# Altium footprint library OpenBMS.PcbLib: 26 footprints (part 2 of 2)
Each footprint in its own frame and in the unit in brackets; x right, y up, seen from the top. Pads: shape width x height; smd on the part's side, far side on the other; paste and mask are expansions set on the pad; w line width, h text height; cw(c..) or ccw(c..) is an arc to the next point about the centre after c.
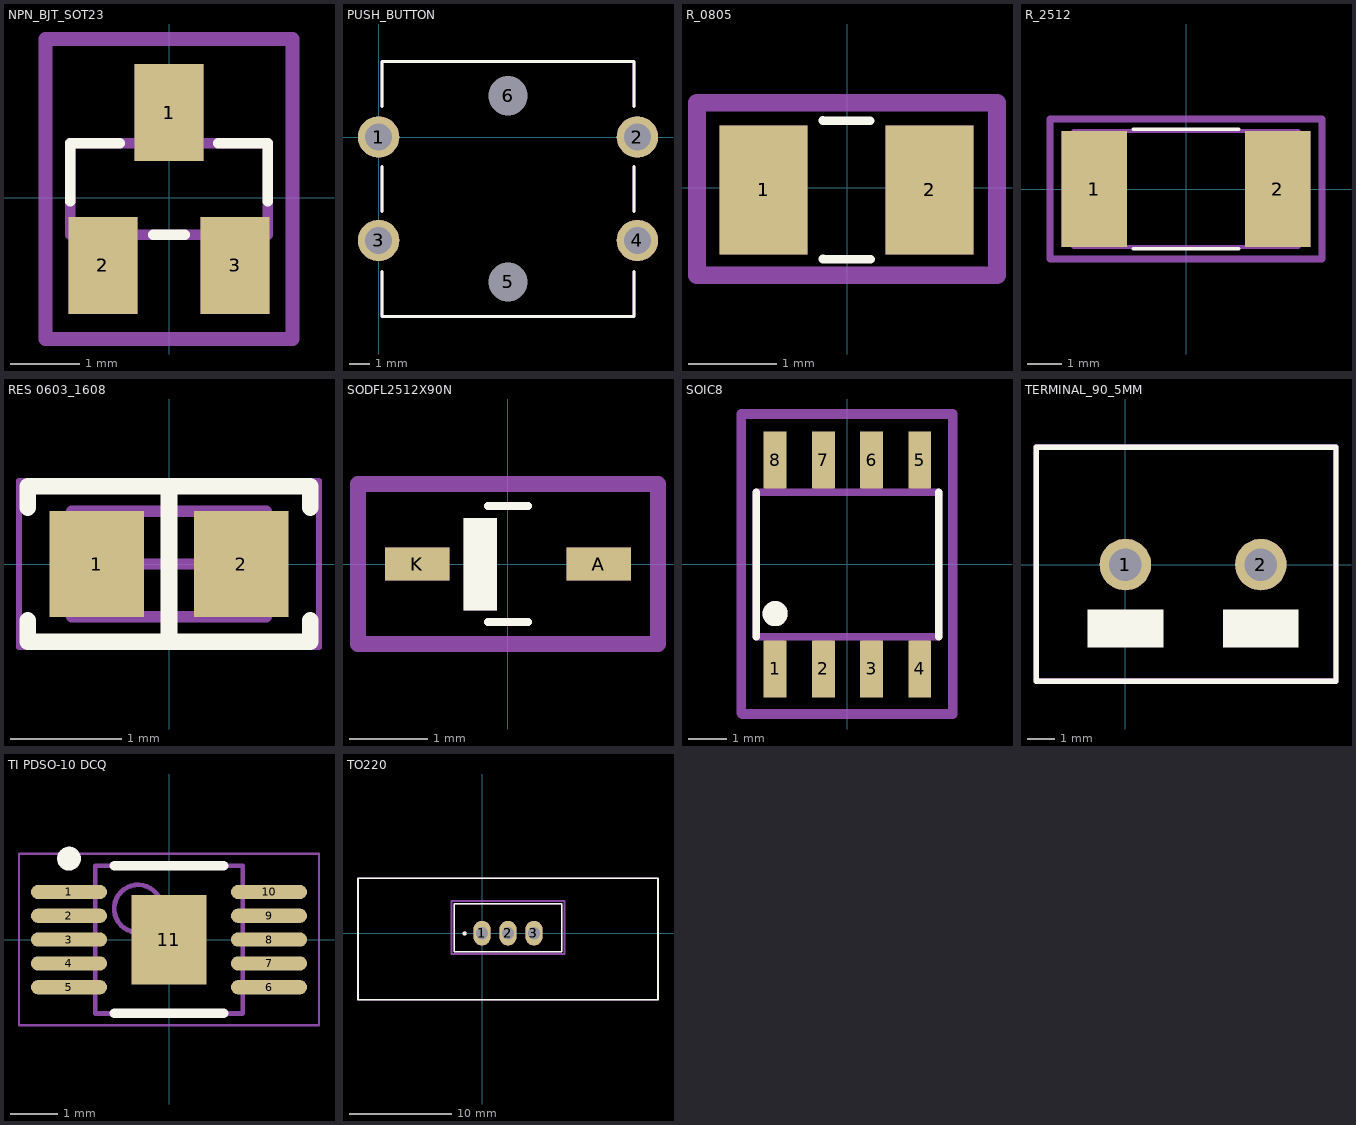
[diagram p1: the footprints below, top view; thin cyan lines are the x and y axes]

## NPN_BJT_SOT23 [mm]
pads (6):
  rect 1x1.4 smd: 1(0,1.227) 2(-0.95,-0.973) 3(0.95,-0.973)
  rect 1x1.4 on Mech15: 1(0,1.227) 2(-0.95,-0.973) 3(0.95,-0.973)
Top Overlay:
  lines w0.152: -1.422,-0.051 -1.422,0.787 -0.711,0.787 ; -0.229,-0.533 0.229,-0.533 ; 0.711,0.787 1.422,0.787 1.422,-0.051
Mechanical 4:
  region: -1.17,-0.584 -0.711,-0.584 -0.711,-1.17 -1.17,-1.17
  region: 0.711,-0.584 1.168,-0.584 1.168,-1.169 0.711,-1.169
  region: -0.229,1.422 0.229,1.422 0.229,0.838 -0.229,0.838
  region: -1.17,-0.584 -0.711,-0.584 -0.711,-1.17 -1.17,-1.17
  region: 0.711,-0.584 1.168,-0.584 1.168,-1.169 0.711,-1.169
  region: -0.229,1.422 0.229,1.422 0.229,0.838 -0.229,0.838
  lines w0.152: -1.422,-0.533 -1.422,0.787 1.422,0.787 1.422,-0.533 -1.422,-0.533
Mechanical 15:
  lines w0.152: -1.422,-0.051 -1.422,0.787 -0.711,0.787 ; -0.229,-0.533 0.229,-0.533 ; 0.711,0.787 1.422,0.787 1.422,-0.051
  lines w0.2: -1.778,-2.032 1.778,-2.032 1.778,2.286 -1.778,2.286 -1.778,-2.032
3D body "BC846B.STEP": height 1.11, standoff 0.01, extent -1.45,-1.023 1.45,1.277

## PUSH_BUTTON [mm]
pads (12):
  round 2 hole 1.3: 1(0,0) 2(12.5,0) 3(0,-5) 4(12.5,-5)
  round 2 on Mech15: 1(0,0) 2(12.5,0) 3(0,-5) 4(12.5,-5)
  round 1.5 hole 1.9: 5(6.25,-7.003) 6(6.25,1.997)
  round 1.5 on Mech15: 5(6.25,-7.003) 6(6.25,1.997)
Top Overlay:
  lines w0.152: 0.154,-6.512 0.154,-8.671 12.346,-8.671 12.346,-6.512 ; 0.154,-3.591 0.154,-1.432 ; 0.154,1.489 0.154,3.648 12.346,3.648 12.346,1.489 ; 12.346,-3.591 12.346,-1.432
Mechanical 15:
  lines w0.152: 0.154,-6.512 0.154,-8.671 12.346,-8.671 12.346,-6.512 ; 0.154,-3.591 0.154,-1.432 ; 0.154,1.489 0.154,3.648 12.346,3.648 12.346,1.489 ; 12.346,-3.591 12.346,-1.432
3D body "b3f-4000.stp": height 4.31, standoff -3.49, extent -0.65,-8.499 13.15,3.501

## R_0805 [mm]
pads (4):
  rect 1x1.47 smd: 1(-0.95,-0.025) 2(0.939,-0.025)
  rect 1x1.47 on Mech15: 1(-0.95,-0.025) 2(0.939,-0.025)
Top Overlay:
  lines w0.1: -0.278,0.765 0.262,0.762 ; -0.275,-0.813 0.265,-0.815
Mechanical 15:
  lines w0.2: -1.709,-0.998 -1.709,0.968 1.707,0.968 1.707,-0.998 -1.709,-0.998
3D body "CRCW08051R96FNEB.STEP": height 0.47, standoff -0.03, extent -1.025,-0.65 0.975,0.6

## R_2512 [mm]
pads (4):
  rect 1.9x3.37 smd: 1(-2.66,0) 2(2.66,0)
  rect 1.9x3.37 on Mech15: 1(-2.66,0) 2(2.66,0)
Top Overlay:
  lines w0.1: -1.524,-1.727 1.524,-1.727 ; -1.524,1.727 1.524,1.727
Mechanical 4:
  lines w0.127: -3.25,-1.68 -3.25,1.68 ; -3.25,-1.68 3.25,-1.68 ; -3.25,-1.68 -3.25,1.68 ; -3.25,-1.68 3.25,-1.68 ; -3.25,1.68 3.25,1.68 ; -3.25,1.68 3.25,1.68 ; 3.25,-1.68 3.25,1.68 ; 3.25,-1.68 3.25,1.68
Mechanical 15:
  lines w0.2: -3.937,-2.032 -3.937,2.032 3.937,2.032 3.937,-2.032 -3.937,-2.032
3D body "CRGP2512F39R.STEP": height 0.66, standoff 0.01, extent -3.2,-1.6 3.15,1.6

## RES 0603_1608 [mm] "Chip Resistor, 2-Leads, Body 1.60x0.80mm, IPC Medium Density"
height 0.45
pads (2):
  rect 0.85x0.95 smd: 1(-0.65,0) 2(0.65,0)
Top Overlay:
  lines w0.15: -1.27,-0.508 -1.27,-0.7 1.27,-0.7 1.27,-0.508 ; -1.27,0.508 -1.27,0.7 1.27,0.7 1.27,0.508 ; 0,-0.7 0,0.7
Mechanical 13:
  lines w0.1: -0.875,-0.475 -0.875,0.475 0.875,0.475 0.875,-0.475 -0.875,-0.475
Mechanical 15:
  lines w0.05: -1.35,-0.75 -1.35,0.75 1.35,0.75 1.35,-0.75 -1.35,-0.75
  lines w0.1: -0.475,0 0.475,0 ; 0,-0.475 0,0.475
3D body "0603 resistor.STEP": height 0.45, standoff 0, extent -0.8,-0.4 0.8,0.4

## SODFL2512X90N [mm]
pads (4):
  rect 0.82x0.42 smd: A(1.15,0) K(-1.15,0)
  rect 0.82x0.42 on Mech15: A(1.15,0) K(-1.15,0)
Top Overlay:
  region: -0.141,-0.584 -0.559,-0.584 -0.559,0.584 -0.141,0.584
  lines w0.1: -0.254,-0.737 0.254,-0.737 ; -0.254,0.737 0.254,0.737
Mechanical 15:
  region: -0.141,-0.584 -0.559,-0.584 -0.559,0.584 -0.141,0.584
  lines w0.1: -0.254,-0.737 0.254,-0.737 ; -0.254,0.737 0.254,0.737
  lines w0.2: -1.905,-1.016 1.905,-1.016 1.905,1.016 -1.905,1.016 -1.905,-1.016
3D body "User Library-SOD-323F.STEP": height 0.78, standoff -0.1, extent -1.368,-0.675 1.332,0.675

## SOIC8 [mm]
pads (8):
  rect 0.6x1.5 smd: 1(-1.905,-2.75) 2(-0.635,-2.75) 3(0.635,-2.75) 4(1.905,-2.75) 5(1.905,2.75) 6(0.635,2.75) 7(-0.635,2.75) 8(-1.905,2.75)
Top Overlay:
  circle w0.508: c-1.905,-1.295 r0.076
  lines w0.203: -2.4,-1.9 -2.4,-1.4 -2.4,1.9 ; 2.4,-1.9 2.4,-1.4 2.4,1.9
Mechanical 15:
  circle w0.508: c-1.905,-1.295 r0.076
  region: 2.15,2 1.66,2 1.66,3.1 2.15,3.1
  region: 2.15,-3.1 1.66,-3.1 1.66,-2 2.15,-2
  region: -1.66,2 -2.15,2 -2.15,3.1 -1.66,3.1
  region: -1.66,-3.1 -2.15,-3.1 -2.15,-2 -1.66,-2
  region: 0.88,2 0.39,2 0.39,3.1 0.88,3.1
  region: 0.88,-3.1 0.39,-3.1 0.39,-2 0.88,-2
  region: -0.39,2 -0.88,2 -0.88,3.1 -0.39,3.1
  region: -0.39,-3.1 -0.88,-3.1 -0.88,-2 -0.39,-2
  lines w0.203: -2.4,-1.9 -2.4,-1.4 -2.4,1.9 2.4,1.9 2.4,-1.4 2.4,-1.9 -2.4,-1.9
  lines w0.254: -2.794,-3.912 -2.769,-3.937 2.769,-3.937 2.769,3.962 -2.794,3.962 -2.794,-3.912
3D body "THVD1429DT--3DModel-STEP-56544.STEP": height 1.75, standoff 0, extent -2.451,-2.997 2.451,2.997

## TERMINAL_90_5MM [mm]
pads (4):
  round 1.9 hole 1.2: 1(0,0) 2(5,0)
  round 1.9 on Mech15: 1(0,0) 2(5,0)
Top Overlay:
  rectangle: 3.603,-3.054 6.397,-1.664
  rectangle: -1.397,-3.054 1.397,-1.664
  lines w0.2: -3.3,-4.3 -3.3,4.336 7.775,4.336 7.775,-4.3 -3.3,-4.3
Mechanical 15:
  lines w0.2: -3.302,-4.293 -3.302,4.343 7.772,4.343 7.772,-4.293 -3.302,-4.293
3D body "37818.stp": height 10.01, standoff -3.49, extent -3.05,-4.064 7.52,4.086

## TI PDSO-10 DCQ [mm] "PDTSSOP, 10-Leads, Body 3.00x3.00mm, Pitch 0.50mm, Thermal Pad 1.88x1.57mm, IPC Medium Density"
height 1.1
pads (11):
  oval 1.6x0.3 smd: 1(-2.1,1) 2(-2.1,0.5) 3(-2.1,0) 4(-2.1,-0.5) 5(-2.1,-1) 6(2.1,-1) 7(2.1,-0.5) 8(2.1,0) 9(2.1,0.5) 10(2.1,1)
  rect 1.57x1.88 smd: 11(0,0)
Top Overlay:
  circle w0.25: c-2.1,1.7 r0.125
  lines w0.2: -1.15,-1.55 1.15,-1.55 ; -1.15,1.55 1.15,1.55
Mechanical 13:
  circle w0.1: c-0.65,0.65 r0.5
  lines w0.1: -1.55,-1.55 -1.55,1.55 1.55,1.55 1.55,-1.55 -1.55,-1.55
Mechanical 15:
  lines w0.05: -3.15,-1.8 -3.15,1.8 3.15,1.8 3.15,-1.8 -3.15,-1.8
  lines w0.1: -0.5,0 0.5,0 ; 0,-0.5 0,0.5
3D body "PDSO-10.STEP": height 1.05, standoff 0, extent -2.46,-1.5 2.46,1.5

## TO220 [mm]
pads (6):
  oval 1.7x2.4 hole 1.2: 1(0,0) 2(2.54,0) 3(5.08,0)
  oval 1.7x2.4 on Mech15: 1(0,0) 2(2.54,0) 3(5.08,0)
Top Overlay:
  circle w0.2: c-1.702,-0.025 r0.1
  lines w0.152: -12.141,-6.502 17.221,-6.502 17.221,5.359 -12.141,5.359 -12.141,-6.502 ; -2.73,-1.8 7.81,-1.8 7.81,2.9 -2.73,2.9 -2.73,-1.8
Mechanical 13:
  lines w0.127: -2.73,-1.8 7.81,-1.8 7.81,2.9 -2.73,2.9 -2.73,-1.8
Mechanical 15:
  circle w0.2: c-1.702,-0.025 r0.1
  lines w0.152: -12.141,-6.502 -12.141,5.359 17.221,5.359 17.221,-6.502 -12.141,-6.502
  lines w0.2: -2.98,-2.052 -2.98,3.148 8.06,3.148 8.06,-2.052 -2.98,-2.052
3D body "LM7805CT--3DModel-STEP-56544.STEP": height 19.4, standoff -10.62, extent -2.444,-1.778 7.525,2.667
3D body "sk_09___l_20.stp": height 20, standoff 0, extent -11.963,-6.318 17.037,5.182